# Altium footprint library power_board_pcbblib.PcbLib: 57 footprints (part 3 of 4)
Each footprint in its own frame and in the unit in brackets; x right, y up, seen from the top. Pads: shape width x height; smd on the part's side, far side on the other; paste and mask are expansions set on the pad; w line width, h text height; cw(c..) or ccw(c..) is an arc to the next point about the centre after c.
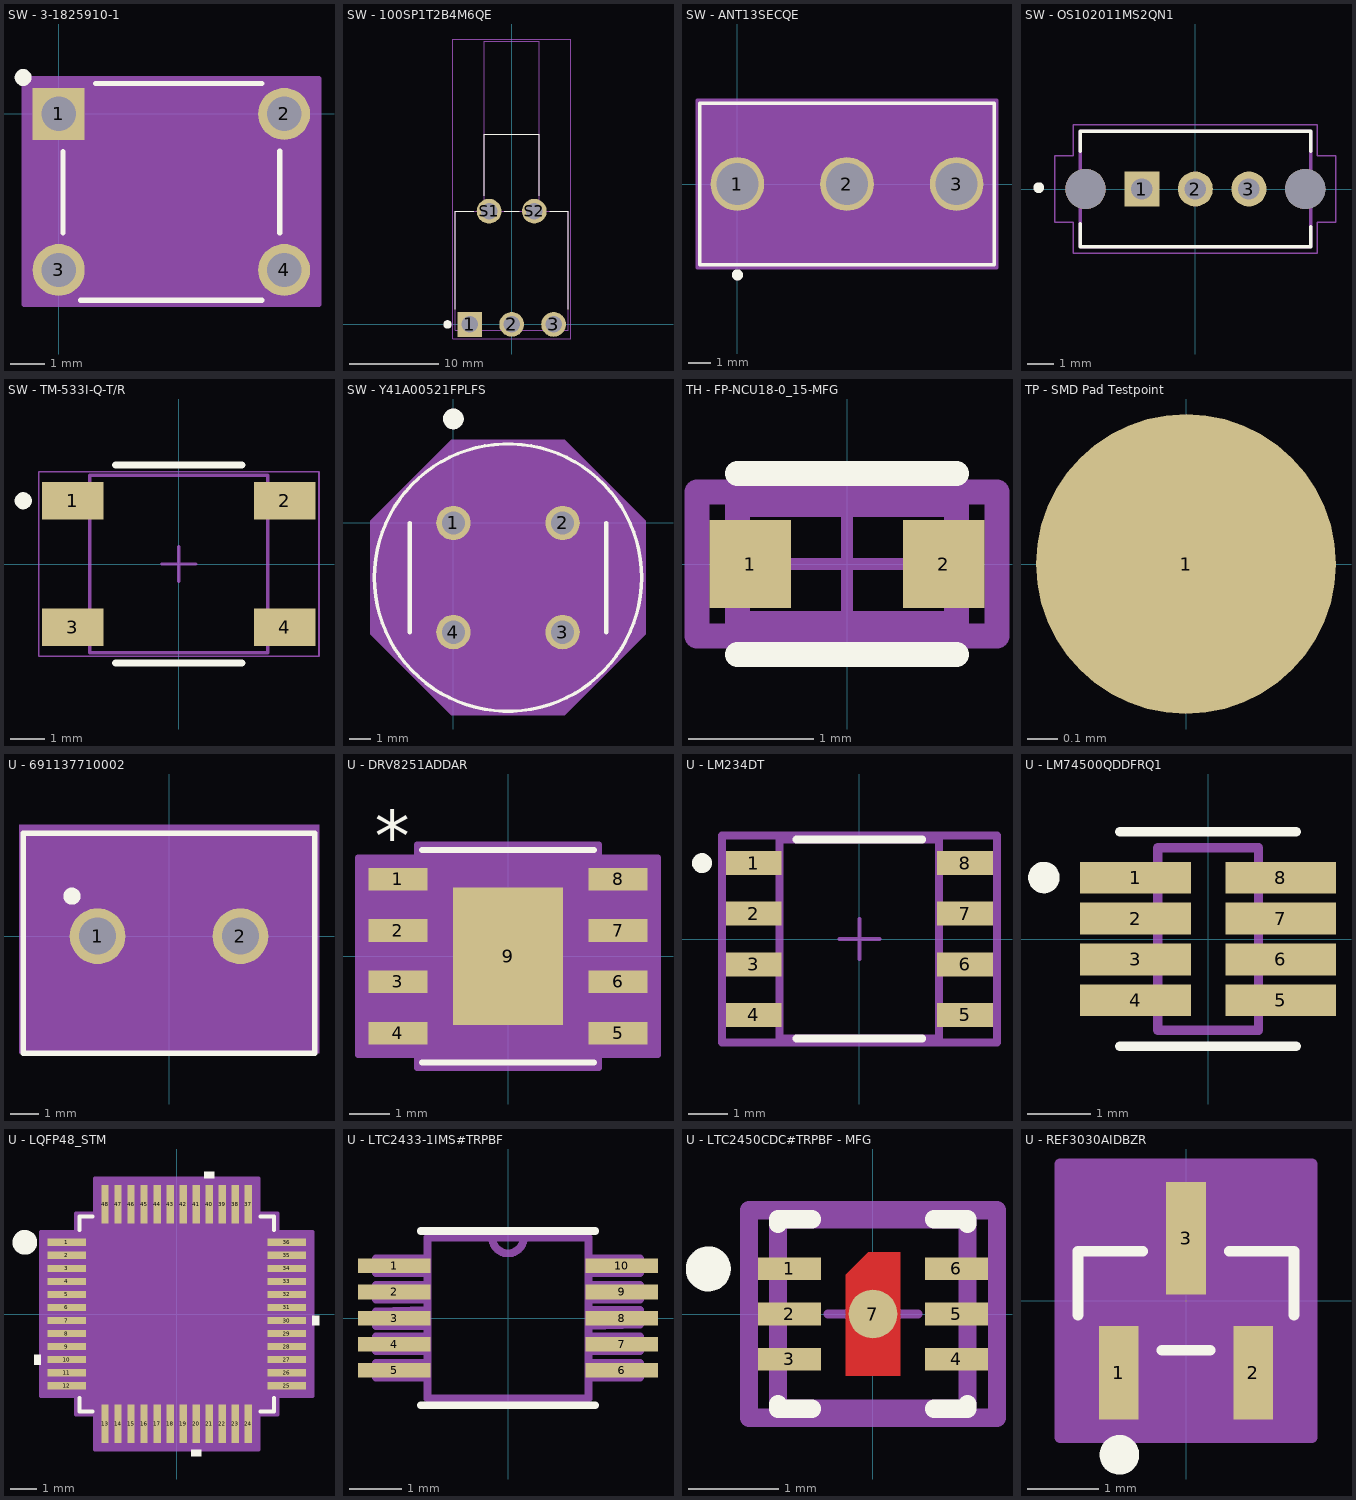
[diagram p2: the footprints below, top view; thin cyan lines are the x and y axes]

## SW - 3-1825910-1 [mil] "3-1825910-1"
pads (4):
  rect 59x59 / inner round 60 / far side rect 59x59 hole 39 paste-99999 mask+0: 1(0,0)
  round 59 / inner round 60 / far side round 59 hole 39 paste-99999 mask-29.5: 2(255.91,0) 3(0,-177.17) 4(255.91,-177.17)
Top Overlay:
  circle w9.84: c-40.35,41.34 r4.72
  lines w6: 4.95,-134.85 4.95,-42.6 ; 25.1,-211.58 230.8,-211.58 ; 41.64,34.42 230.8,34.42 ; 250.95,-134.85 250.95,-42.31
Mechanical 13:
  lines w0: 115.95,29.42 ccw(c127.95,29.42) 139.95,29.42
  lines w1: -19.5,-196.67 9.95,-196.67 9.95,-157.67 -19.5,-157.67 -19.5,-196.67 ; -19.5,-19.5 9.95,-19.5 9.95,19.5 -19.5,19.5 -19.5,-19.5 ; 9.95,-206.58 9.95,29.42 245.95,29.42 245.95,-206.58 9.95,-206.58 ; 245.95,-196.67 275.41,-196.67 275.41,-157.67 245.95,-157.67 245.95,-196.67 ; 245.95,-19.5 275.41,-19.5 275.41,19.5 245.95,19.5 245.95,-19.5
  text "*" at 33.41,-12.17 h50
Mechanical 15:
  region: 255.91,-216.17 295.41,-216.17 295.41,39.83 255.91,39.83 255.91,39.42 -0.05,39.42 0,39.83 -39.5,39.83 -39.5,-216.17 0,-216.17 -0.05,-216.58 255.91,-216.58
  lines w6: -39.5,-216.17 295.41,-216.17 295.41,39.83 -39.5,39.83 -39.5,-216.17
3D body "c-3-1825910-1-c-3d.stp": height 669.79, standoff -137.69, extent -23.62,-204.53 283.46,31.3

## SW - 100SP1T2B4M6QE [mm]
pads (5):
  rect 2.775x2.775 / inner round 2.775 / far side rect 2.775x2.775 hole 1.85: 1(-4.7,0)
  round 2.775 hole 1.85: 2(0,0) 3(4.7,0) S1(-2.54,12.7) S2(2.54,12.7)
Top Overlay:
  circle w0.5: c-7.2,0 r0.225
  lines w0.127: -6.35,1.707 -6.35,12.7 -4.247,12.7 ; -3.085,14.407 -3.085,21.35 3.085,21.35 3.085,14.407 ; -0.833,12.7 0.833,12.7 ; 4.247,12.7 6.35,12.7 6.35,1.707
Mechanical 13:
  lines w0.127: -3.085,12.7 -3.085,31.76 3.085,31.76 3.085,12.7 ; -3.085,12.7 -6.35,12.7 -6.35,-0.635 6.35,-0.635 6.35,12.7 3.085,12.7 ; -3.085,12.7 3.085,12.7
Mechanical 15:
  lines w0.05: -6.6,-1.637 6.6,-1.637 6.6,32.01 -6.6,32.01 -6.6,-1.637
3D body "step_temp.STEP": height 6.86, standoff -3.17, extent -6.35,-0.635 6.35,26.515

## SW - ANT13SECQE [mil] "ANT13SECQE"
pads (3):
  round 93 hole 73 paste-99999 mask+0: 1(0,0) 2(190,0) 3(380,0)
Top Overlay:
  circle w9.84: c0,-157.48 r4.72
  lines w6: -65,-140 445,-140 445,140 -65,140 -65,-140
Mechanical 13:
  circle w20: c0,75 r15
  lines w1: -60,-135 440,-135 440,135 -60,135 -60,-135
Mechanical 15:
  region: 450,145 -70,145 -70,-145 450,-145
  lines w6: -70,-145 -70,145 450,145 450,-145 -70,-145
3D body "ANT13SECQE.stp": height 1060.35, standoff -249.32, extent -60,-135.04 440,135.04

## SW - OS102011MS2QN1 [mm]
pads (5):
  rect 1.308x1.308 / inner round 1.308 / far side rect 1.308x1.308 hole 0.8: 1(-2,0)
  round 1.308 hole 0.8: 2(0,0) 3(2,0)
  round 1.5 hole 1.5 unplated: ""(-4.1,0) ""(4.1,0)
Top Overlay:
  circle w0.2: c-5.85,0.05 r0.1
  lines w0.127: -4.3,-1.3 -4.3,-2.15 4.3,-2.15 4.3,-1.4 ; -4.3,1.4 -4.3,2.15 4.3,2.15 4.3,1.4
Mechanical 13:
  circle w0.2: c-2.1,0.05 r0.1
  lines w0.127: -4.3,-2.15 4.3,-2.15 4.3,2.15 -4.3,2.15 -4.3,-2.15
Mechanical 15:
  lines w0.05: -5.25,-1.25 -4.55,-1.25 -4.55,-2.4 4.55,-2.4 4.55,-1.25 5.25,-1.25 5.25,1.25 4.55,1.25 4.55,2.4 -4.55,2.4 -4.55,1.25 -5.25,1.25 -5.25,-1.25
3D body "step_temp.STEP": height 4.4, standoff -7.1, extent -4.3,-2.15 4.3,2.15

## SW - TM-533I-Q-T/R [mm]
pads (4):
  rect 1.8x1.1 smd: 1(-3.1,1.85) 2(3.1,1.85) 3(-3.1,-1.85) 4(3.1,-1.85)
Top Overlay:
  circle w0.25: c-4.55,1.85 r0.125
  lines w0.2: -1.85,-2.9 1.85,-2.9 ; -1.85,2.9 1.85,2.9
Mechanical 13:
  lines w0.1: -2.6,-2.6 -2.6,2.6 2.6,2.6 2.6,-2.6 -2.6,-2.6
Mechanical 15:
  lines w0.05: -4.1,-2.7 4.1,-2.7 4.1,2.7 -4.1,2.7 -4.1,-2.7
  lines w0.1: -0.5,0 0.5,0 ; 0,-0.5 0,0.5
3D body: height 1.74, standoff 0.05, extent -0.992,-0.998 1,0.998
3D body: height 1.69, standoff 0, extent -2.6,-2.6 2.6,2.6

## SW - Y41A00521FPLFS [mil]
pads (4):
  round 62 / inner round 60 / far side round 62 hole 42 paste-99999 mask+0: 1(0,0) 2(196.85,0) 3(196.85,-196.85) 4(0,-196.85)
Top Overlay:
  circle w6: c98.43,-98.42 r241
  circle w19.68: c0,187.57 r8.86
  lines w7.87: -78.74,-196.85 -78.74,0 ; 275.59,-196.85 275.59,0
Mechanical 13:
  circle w0: c98.43,-98.42 r236
  circle w0: c98.43,-98.42 r177
  text "RefDes2" at 10.93,-123.42 h50
Mechanical 15:
  region: -147.57,2.87 -2.87,147.57 199.72,147.57 344.43,2.87 344.43,-199.72 199.72,-344.43 -2.87,-344.43 -147.57,-199.72
  lines w6: -147.57,-199.72 -147.57,2.87 -2.87,147.57 199.72,147.57 344.43,2.87 344.43,-199.72 199.72,-344.43 -2.87,-344.43 -147.57,-199.72
3D body "D6R90F2LFS.stp": height 563.5, standoff -137.29, extent -137.8,-311.02 334.65,137.34

## TH - FP-NCU18-0_15-MFG [mm]
pads (2):
  rect 0.65x0.7 smd paste+0 mask+0: 1(-0.775,0) 2(0.775,0)
Top Overlay:
  lines w0.2: -0.875,-0.725 0.875,-0.725 ; -0.875,0.725 0.875,0.725
Top 3D Body:
  lines w0.2: -0.875,-0.475 0.875,-0.475 0.875,0.475 -0.875,0.475 -0.875,-0.475
Top Courtyard:
  lines w0.2: -1.2,-0.575 1.2,-0.575 1.2,0.575 -1.2,0.575 -1.2,-0.575
Top Assembly:
  lines w0.2: -1.2,-0.575 1.2,-0.575 1.2,0.575 -1.2,0.575 -1.2,-0.575
Top Component Center:
  lines w0.1: -0.5,0 0.5,0 ; 0,-0.5 0,0.5
3D body "Res_Murata_NCU18WB473J6SRB_eec.STEP": height 0.25, standoff 0, extent -1.2,-0.575 1.2,0.575

## TP - SMD Pad Testpoint [mm]
pads (1):
  round 1 smd paste-2539.97: 1(0,0)

## U - 691137710002 [mm]
pads (2):
  round 1.95 hole 1.3: 1(-2.5,0) 2(2.5,0)
Top Overlay:
  circle w0.4: c-3.4,1.4 r0.1
  lines w0.2: -5.1,-4.1 5.1,-4.1 5.1,3.6 -5.1,3.6 -5.1,-4.1
Mechanical 13:
  lines w0.1: -5,-4 5,-4 5,3.5 -5,3.5 -5,-4
Mechanical 15:
  region: 5.25,-4.1 -5.25,-4.1 -5.25,3.9 5.25,3.9
3D body "step_temp.STEP": height 11.5, standoff -3.6, extent -5,-3.9 5,3.6

## U - DRV8251ADDAR [mil]
pads (9):
  rect 57.5x22 smd paste+0 mask+0: 1(-107.25,75) 2(-107.25,25) 3(-107.25,-25) 4(-107.25,-75) 5(107.25,-75) 6(107.25,-25) 7(107.25,25) 8(107.25,75)
  rect 107x134 smd paste-66.5 mask+0: 9(0,0)
Top Overlay:
  lines w6: -83.5,-103.5 83.5,-103.5 ; -83.5,103.5 83.5,103.5
  text "*" at -129.75,92 h50
Top Paste:
  region: -3.94,63.06 -49.56,63.06 -49.56,3.94 -3.94,3.94
  region: -3.94,-3.94 -49.56,-3.94 -49.56,-63.06 -3.94,-63.06
  region: 49.56,63.06 3.94,63.06 3.94,3.94 49.56,3.94
  region: 49.56,-3.94 3.94,-3.94 3.94,-63.06 49.56,-63.06
Mechanical 13:
  lines w1: -12,98.5 ccw(c0,98.5) 12,98.5 ; -122,-85 -122,-65 -78.5,-65 -78.5,-85 -122,-85 ; -122,-35 -122,-15 -78.5,-15 -78.5,-35 -122,-35 ; -122,15 -122,35 -78.5,35 -78.5,15 -122,15 ; -122,65 -122,85 -78.5,85 -78.5,65 -122,65 ; -78.5,-98.5 78.5,-98.5 78.5,98.5 -78.5,98.5 -78.5,-98.5 ; 78.5,-85 78.5,-65 122,-65 122,-85 78.5,-85 ; 78.5,-35 78.5,-15 122,-15 122,-35 78.5,-35 ; 78.5,15 78.5,35 122,35 122,15 78.5,15 ; 78.5,65 78.5,85 122,85 122,65 78.5,65
  text "*" at -76,45.5 h50
Mechanical 15:
  region: -88.5,-96 -146,-96 -146,96 -88.5,96 -88.5,108.5 88.5,108.5 88.5,96 146,96 146,-96 88.5,-96 88.5,-108.5 -88.5,-108.5
  lines w6: -146,-96 -146,96 -88.5,96 -88.5,108.5 88.5,108.5 88.5,96 146,96 146,-96 88.5,-96 88.5,-108.5 -88.5,-108.5 -88.5,-96 -146,-96
3D body "SOIC8_DDA_TEX.step": height 67.09, standoff 0, extent -122.01,-98.5 122.01,98.5

## U - LM234DT [mm]
pads (8):
  rect 1.4x0.6 smd paste+0 mask+0: 1(-2.65,1.905) 2(-2.65,0.635) 3(-2.65,-0.635) 4(-2.65,-1.905) 5(2.65,-1.905) 6(2.65,-0.635) 7(2.65,0.635) 8(2.65,1.905)
Top Overlay:
  circle w0.25: c-3.95,1.905 r0.125
  lines w0.2: -1.575,-2.5 1.575,-2.5 ; -1.575,2.5 1.575,2.5
Top 3D Body:
  lines w0.2: -2,-2.5 -2,2.5 2,2.5 2,-2.5 -2,-2.5
Board:
  lines w0.2: -3.45,-2.6 -3.45,2.6 3.45,2.6 3.45,-2.6 -3.45,-2.6
Top Assembly:
  lines w0.2: -3.45,-2.6 -3.45,2.6 3.45,2.6 3.45,-2.6 -3.45,-2.6
  text ".Designator" at 0,0.188 h1
Top Component Center:
  lines w0.1: -0.5,0 0.5,0 ; 0,-0.5 0,0.5
3D body "IC_STMICROELECTRONICS_LM234DT_eec.STEP": height 0.25, standoff 0, extent -3.45,-2.6 3.45,2.6

## U - LM74500QDDFRQ1 [mm]
pads (8):
  rect 1.757x0.5 smd paste+0 mask+0: 1(-1.151,0.975) 2(-1.151,0.325) 3(-1.151,-0.325) 4(-1.151,-0.975) 5(1.151,-0.975) 6(1.151,-0.325) 7(1.151,0.325) 8(1.151,0.975)
Top Overlay:
  circle w0.25: c-2.604,0.975 r0.125
  lines w0.15: -1.4,-1.7 1.4,-1.7 ; -1.4,1.7 1.4,1.7
Mechanical 13:
  lines w0.15: -0.8,-1.45 0.8,-1.45 0.8,1.45 -0.8,1.45 -0.8,-1.45
3D body "LM74500QDDFRQ1.step": height 1.01, standoff -0.09, extent -1.4,-1.45 1.4,1.45

## U - LQFP48_STM [mil] "STM32H523CCT7"
pads (48):
  rect 58x11 smd paste+0 mask+0: 1(-166,108.27) 2(-166,88.58) 3(-166,68.9) 4(-166,49.21) 5(-166,29.53) 6(-166,9.84) 7(-166,-9.84) 8(-166,-29.53) 9(-166,-49.21) 10(-166,-68.9) 11(-166,-88.58) 12(-166,-108.27) 25(166,-108.27) 26(166,-88.58) 27(166,-68.9) 28(166,-49.21) 29(166,-29.53) 30(166,-9.84) 31(166,9.84) 32(166,29.53) 33(166,49.21) 34(166,68.9) 35(166,88.58) 36(166,108.27)
  rect 11x58 smd paste+0 mask+0: 13(-108.27,-166) 14(-88.58,-166) 15(-68.9,-166) 16(-49.21,-166) 17(-29.53,-166) 18(-9.84,-166) 19(9.84,-166) 20(29.53,-166) 21(49.21,-166) 22(68.9,-166) 23(88.58,-166) 24(108.27,-166) 37(108.27,166) 38(88.58,166) 39(68.9,166) 40(49.21,166) 41(29.53,166) 42(9.84,166) 43(-9.84,166) 44(-29.53,166) 45(-49.21,166) 46(-68.9,166) 47(-88.58,166) 48(-108.27,166)
Top Overlay:
  circle w19.68: c-229.33,108.27 r8.86
  region: 56.71,205 41.71,205 41.71,215 56.71,215
  region: 205,-2.34 215,-2.34 215,-17.34 205,-17.34
  region: 37.03,-205 22.03,-205 22.03,-215 37.03,-215
  region: -205,-61.4 -215,-61.4 -215,-76.4 -205,-76.4
  lines w6: -147,-126.87 -147,-147 -126.87,-147 ; -147,126.87 -147,147 -126.87,147 ; 126.87,-147 147,-147 147,-126.87 ; 126.87,147 147,147 147,126.87
Mechanical 13:
  drawing of 197 lines, arcs and shapes, not listed
  text "*" at -139.5,93.11 h50
Mechanical 15:
  region: -123.77,-152 -152,-152 -152,-123.77 -205,-123.77 -205,123.77 -152,123.77 -152,152 -123.77,152 -123.77,205 123.77,205 123.77,152 152,152 152,123.77 205,123.77 205,-123.77 152,-123.77 152,-152 123.77,-152 123.77,-205 -123.77,-205
  lines w6: -205,-123.77 -205,123.77 -152,123.77 -152,152 -123.77,152 -123.77,205 123.77,205 123.77,152 152,152 152,123.77 205,123.77 205,-123.77 152,-123.77 152,-152 123.77,-152 123.77,-205 -123.77,-205 -123.77,-152 -152,-152 -152,-123.77 -205,-123.77
3D body "LQFP48_STM.step": height 63.11, standoff 0, extent -180.98,-180.98 180.98,180.98

## U - LTC2433-1IMS#TRPBF [mil]
pads (10):
  rect 55x11 smd paste+0 mask+4.02: 1(-86,39.4) 2(-86,19.7) 3(-86,0) 4(-86,-19.7) 5(-86,-39.4) 6(86,-39.4) 7(86,-19.7) 8(86,0) 9(86,19.7) 10(86,39.4)
Top Overlay:
  lines w6: -66,-66 66,-66 ; -66,66 66,66
Mechanical 13:
  lines w6: -12,61 ccw(c0,61) 12,61 ; -12,61 -61,61 -61,-61 61,-61 61,61 12,61 ; -12,61 12,61 ; -100,-45 -61,-45 -61,-34 -100,-34 -100,-45 ; -100,-25 -61,-25 -61,-14 -100,-14 -100,-25 ; -100,-6 -61,-6 -61,6 -100,5 -100,-6 ; -100,14 -61,14 -61,25 -100,25 -100,14 ; -100,34 -61,34 -61,45 -100,45 -100,34 ; 61,-45 100,-45 100,-34 61,-34 61,-45 ; 61,-25 100,-25 100,-14 61,-14 61,-25 ; 61,-6 100,-5 100,6 61,6 61,-6 ; 61,14 100,14 100,25 61,25 61,14 ; 61,34 100,34 100,45 61,45 61,34
3D body "LTC2433-1IMS_TRPBF.step": height 37.81, standoff -5.5, extent -96.46,-59.06 96.46,59.06

## U - LTC2450CDC#TRPBF - MFG [mm]
pads (7):
  rect 0.7x0.25 smd paste+0 mask+0: 1(-0.925,0.5) 2(-0.925,0) 3(-0.925,-0.5) 4(0.925,-0.5) 5(0.925,0) 6(0.925,0.5)
  round 0.54 smd paste+0 mask+0: 7(0,0)
Top Layer:
  region: -0.3,-0.685 0.3,-0.685 0.3,0.685 -0.05,0.685 -0.3,0.435
Top Overlay:
  circle w0.25: c-1.825,0.5 r0.125
  lines w0.2: -1.05,-1 -1.05,-1.05 -0.675,-1.05 ; -1.05,1 -1.05,1.05 -0.675,1.05 ; 0.675,-1.05 1.05,-1.05 1.05,-1 ; 0.675,1.05 1.05,1.05 1.05,1
Top 3D Body:
  lines w0.2: -1.05,-1.05 1.05,-1.05 1.05,1.05 -1.05,1.05 -1.05,-1.05
Board:
  lines w0.2: -1.375,-1.15 1.375,-1.15 1.375,1.15 -1.375,1.15 -1.375,-1.15
Top Assembly:
  lines w0.2: -1.375,-1.15 1.375,-1.15 1.375,1.15 -1.375,1.15 -1.375,-1.15
  text ".Designator" at 0,0.188 h1
Top Component Center:
  lines w0.1: -0.5,0 0.5,0 ; 0,-0.5 0,0.5
3D body "IC_Analog_Devices_LTC4311IDC#TRMPBF_eec.STEP": height 0.25, standoff 0, extent -1.375,-1.15 1.375,1.15

## U - REF3030AIDBZR [mil]
pads (3):
  rect 22x52 smd paste-26 mask-26: 1(-37.4,-40) 2(37.4,-40)
  rect 22x62.5 smd paste-31.25 mask-31: 3(0,34.75)
Top Overlay:
  circle w11.81: c-37,-85.69 r5.1
  lines w6: -60,-7.91 -60,27.5 -24.1,27.5 ; -13.3,-27.5 13.3,-27.5 ; 24.1,27.5 60,27.5 60,-7.91
Mechanical 13:
  lines w1: -60,-27.5 60,-27.5 60,27.5 -60,27.5 -60,-27.5 ; -47.4,-52 -47.4,-27.5 -27.4,-27.5 -27.4,-52 -47.4,-52 ; -10,27.5 10,27.5 10,52 -10,52 -10,27.5 ; 27.4,-52 27.4,-27.5 47.4,-27.5 47.4,-52 27.4,-52
Mechanical 15:
  region: 70,-76 -70,-76 -70,76 70,76
  lines w6: -70,-76 -70,76 70,76 70,-76 -70,-76
3D body "DBZ3.step": height 44.09, standoff 0, extent -60,-27.48 60,27.48